# Altium footprint library JL_PCB.PCBLIB: 1129 footprints (part 6 of 72)
Each footprint in its own frame and in the unit in brackets; x right, y up, seen from the top. Pads: shape width x height; smd on the part's side, far side on the other; paste and mask are expansions set on the pad; w line width, h text height; cw(c..) or ccw(c..) is an arc to the next point about the centre after c.
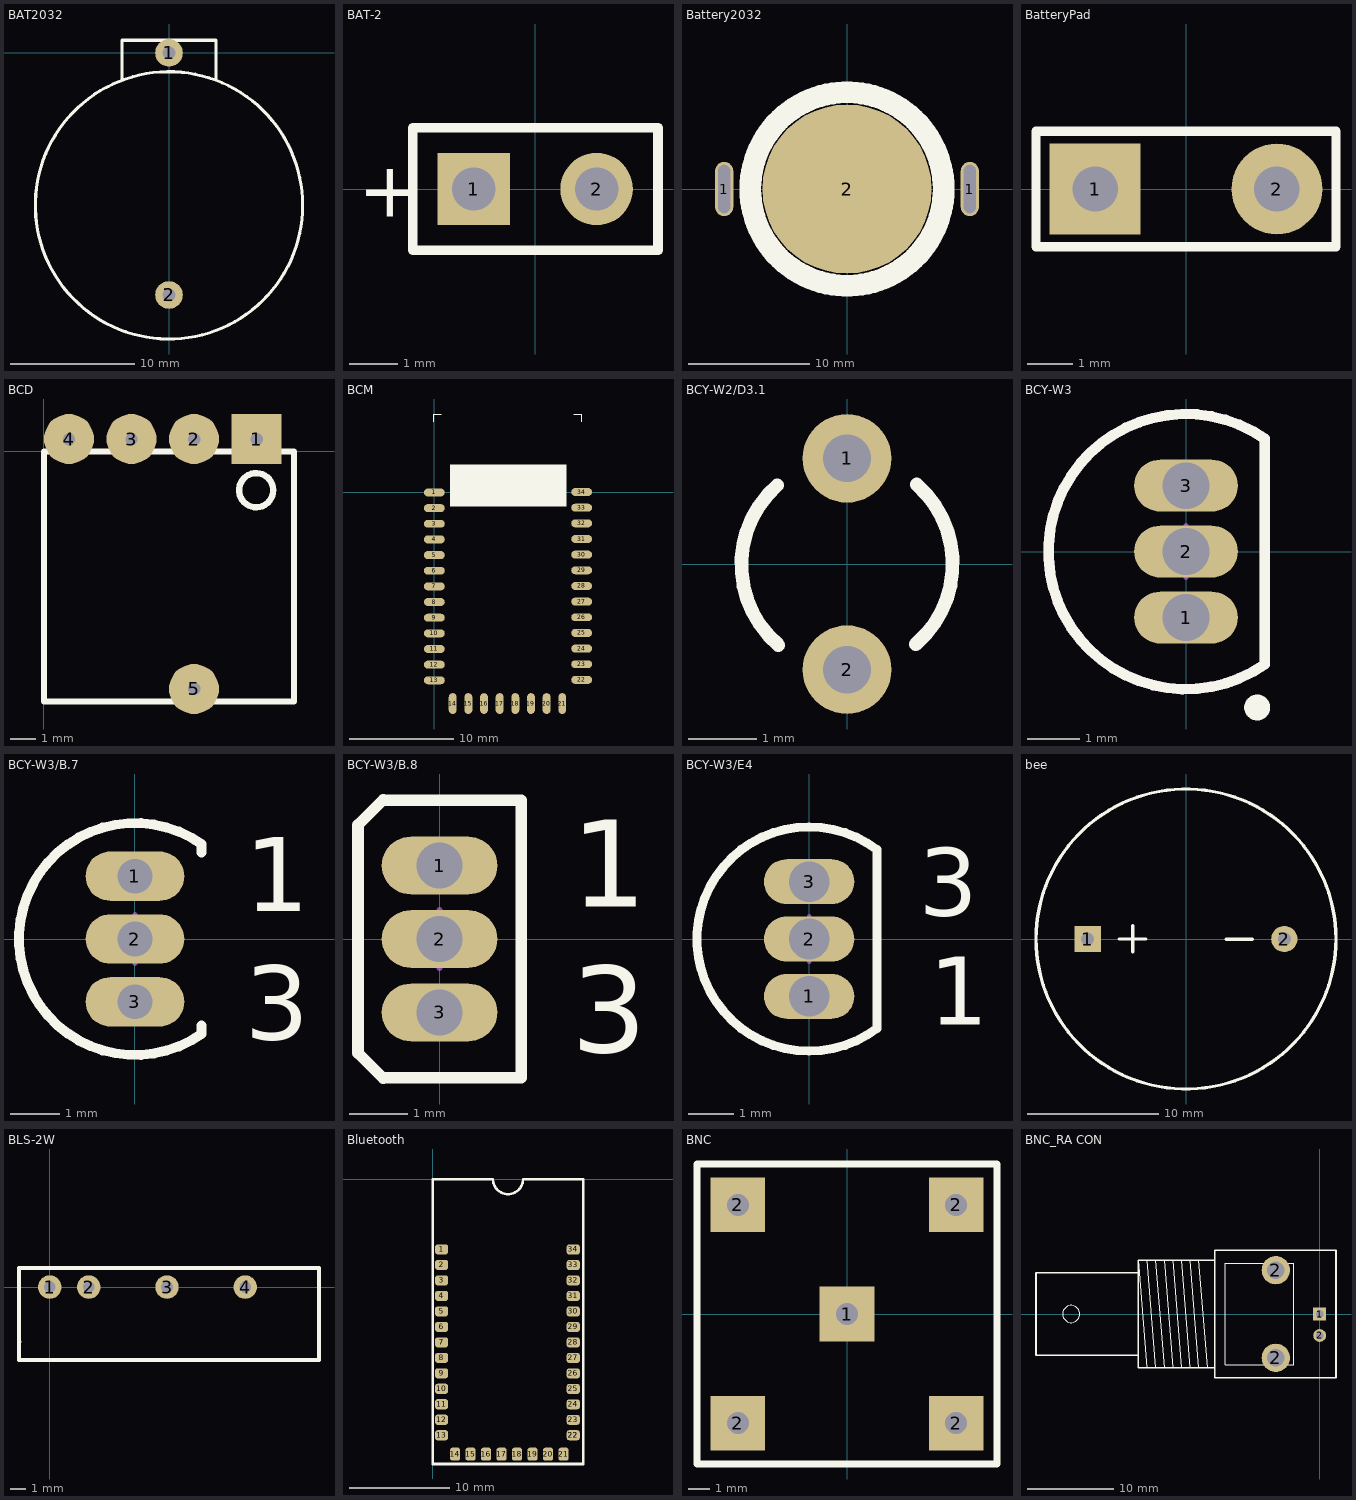
[diagram p5: the footprints below, top view; thin cyan lines are the x and y axes]

## BAT2032 [mil]
pads (2):
  round 88 hole 40: 1(0,0) 2(0,-770)
TopOverlay:
  circle w10: c0,-485 r425
  lines w10: -150,-85 -150,40 0,40 150,40 150,-85

## BAT-2 [mm] "Multicell Battery; 2 Leads"
pads (2):
  rect 1.5x1.5 hole 0.9: 1(-1.27,0)
  round 1.5 hole 0.9: 2(1.27,0)
TopOverlay:
  lines w0.2: -2.54,-1.27 -2.54,1.27 2.54,1.27 2.54,-1.27 -2.54,-1.27
  text "+" at -3.67,-0.577 h1.15

## Battery2032 [mm] "3V"
pads (3):
  oval 1.5x4.5 hole 1 slot 4 at 90 deg: 1(-10.16,0) 1(10.16,0)
  round 14 all layers, no hole: 2(0,0)
TopOverlay:
  circle w1.8: c0,0 r8

## BatteryPad [mm]
pads (2):
  rect 2x2 hole 1: 1(-2,0)
  round 2 hole 1: 2(2,0)
TopOverlay:
  lines w0.2: -3.3,-1.27 -3.3,1.27 3.3,1.27 3.3,-1.27 -3.3,-1.27

## BCD [mm]
pads (5):
  rect 2x2 hole 0.5: 1(8.5,0.5)
  round 2 hole 0.5: 2(6,0.5) 3(3.5,0.5) 4(1,0.5) 5(6,-9.5)
TopOverlay:
  circle w0.254: c8.486,-1.549 r0.683
  lines w0.254: 0,-10 0,0 10,0 10,-10 0,-10

## BCM [mm]
pads (34):
  oval 2x0.76 smd: 1(0.01,0) 2(0.01,-1.5) 3(0.01,-3) 4(0.01,-4.5) 5(0.01,-6) 6(0.01,-7.5) 7(0.01,-9) 8(0.01,-10.5) 9(0.01,-12) 10(0.01,-13.5) 11(0.01,-15) 12(0.01,-16.5) 13(0.01,-18) 22(14.13,-17.96) 23(14.13,-16.46) 24(14.13,-14.96) 25(14.13,-13.46) 26(14.13,-11.96) 27(14.13,-10.46) 28(14.13,-8.96) 29(14.13,-7.46) 30(14.13,-5.96) 31(14.13,-4.46) 32(14.13,-2.96) 33(14.13,-1.46) 34(14.13,0.04)
  oval 0.76x2 smd: 14(1.77,-20.23) 15(3.27,-20.23) 16(4.77,-20.23) 17(6.27,-20.23) 18(7.77,-20.23) 19(9.27,-20.23) 20(10.77,-20.23) 21(12.27,-20.23)
TopOverlay:
  region: 12.689,-1.33 12.689,2.67 1.489,2.67 1.489,-1.33
  lines w0.1: -0.06,6.77 -0.06,7.52 0.69,7.52 ; 13.39,7.52 14.14,7.52 14.14,6.77

## BCY-W2/D3.1 [mm] "Crystal, Thru-Hole; 2 Leads; Body 3.1 x 8.2 mm (Dia.xH)"
height 8.2
pads (2):
  round 1.3 hole 0.7: 1(0,1.55) 2(0,-1.55)
TopOverlay:
  lines w0.2: -1.022,1.155 ccw(c0,-0.01) -1.006,-1.189 ; 1.006,-1.179 ccw(c0,0) 1.022,1.165

## BCY-W3 [mm] "TO, Flat Index; 3 In-Line, Axial Leads; Body Dia. 4.8mm; Leads 0.55 x 0.51 mm (max)"
height 5.33
pads (3):
  oval 2x1 hole 0.9: 1(0,-1.27) 2(0,0) 3(0,1.27)
TopOverlay:
  circle w0.25: c1.371,-3.003 r0.125
  lines w0.2: 1.52,-2.171 cw(c0,0) 1.52,2.171 1.52,-2.171
Mechanical13:
  lines w0.2: 1.52,-2.171 cw(c0,0) 1.52,2.171 1.52,-2.171
Mechanical15:
  lines w0.1: -0.5,0 0.5,0 ; 0,-0.5 0,0.5
3D body: height 5.33, standoff 0, extent -2.651,-2.661 1.52,2.661

## BCY-W3/B.7 [mm] "TO, Flat Index; 3 In-Line, Axial Leads; Body Dia. 4.6mm; Leads 0.41 x 0.39 mm (max)"
height 4.7
pads (3):
  oval 2x1 hole 0.7: 1(0,1.27) 2(0,0) 3(0,-1.27)
TopOverlay:
  lines w0.2: 1.35,-1.75 1.35,-1.92 cw(c0,0) 1.35,1.92 1.35,1.75
  text "3" at 2.224,-2.035 h1.5
  text "1" at 2.224,0.56 h1.5
Mechanical15:
  lines w0.1: -0.5,0 0.5,0 ; 0,-0.5 0,0.5
3D body "TO-92A.STEP": height 8, standoff -3, extent -2.406,-2.4 1.524,2.4

## BCY-W3/B.8 [mm] "TO, Flat Index; 3 In-Line, Axial Leads; Body Dia. 4.6mm; Lead Dia. 0.5 mm (max)"
height 4.01
pads (3):
  oval 2x1 hole 0.8: 1(0,1.27) 2(0,0) 3(0,-1.27)
TopOverlay:
  lines w0.2: -0.97,-2.41 -1.41,-1.97 -1.41,1.97 -0.97,2.41 ; -0.97,-2.4 1.41,-2.4 1.41,2.4 -0.97,2.4
  text "3" at 2.275,-1.963 h1.5
  text "1" at 2.275,0.555 h1.5
Mechanical15:
  lines w0.1: -0.5,0 0.5,0 ; 0,-0.5 0,0.5

## BCY-W3/E4 [mm] "TO, Flat Index; 3 In-Line, Axial Leads; Body Dia. 4.5mm; Leads 0.51 x 0.48 mm (max)"
height 6.86
pads (3):
  oval 2x1 hole 0.9: 1(0,-1.27) 2(0,0) 3(0,1.27)
TopOverlay:
  lines w0.2: 1.5,-1.98 cw(c0,0) 1.5,1.98 1.5,-1.98
  text "1" at 2.66,-1.9 h1.5
  text "3" at 2.43,0.51 h1.5
Mechanical15:
  lines w0.1: -0.5,0 0.5,0 ; 0,-0.5 0,0.5
3D body "TO-92A.STEP": height 8, standoff -3, extent -2.388,-2.4 1.542,2.4

## bee [mm]
pads (2):
  rect 2x2 hole 1: 1(-7.493,0)
  round 2 hole 1: 2(7.493,0)
TopOverlay:
  circle w0.254: c0,0 r11.431
  lines w0.254: -5.08,0 -3.048,0 ; -4.064,-0.991 -4.064,1.016 ; 3.048,-0.025 5.055,-0.025
3D body "User Library-CEP2242_Buzzer.step": height 7.59, standoff -5.5, extent -6.998,-7.137 6.693,6.553

## BLS-2W [mil]
pads (4):
  round 60 hole 30: 1(0,0) 2(100,0) 3(300,0) 4(500,0)
TopOverlay:
  lines w10: -78.74,-138.74 -77.48,-140 ; -78.74,-187.01 688.98,-187.01 688.98,49.21 -78.74,49.21 -78.74,-187.01

## Bluetooth [mm]
pads (35):
  rrect50% 1.3x1 smd: 1(0.9,-6.99) 2(0.9,-8.53) 3(0.9,-10.07) 4(0.9,-11.61) 5(0.9,-13.15) 6(0.9,-14.69) 7(0.9,-16.23) 8(0.9,-17.77) 9(0.9,-19.31) 10(0.9,-20.85) 11(0.9,-22.39) 12(0.9,-23.93) 13(0.9,-25.474) 22(13.987,-25.474) 22(13.987,-25.474) 23(13.987,-23.934) 24(13.987,-22.394) 25(13.987,-20.854) 26(13.987,-19.314) 27(13.987,-17.774) 28(13.987,-16.234) 29(13.987,-14.694) 30(13.987,-13.154) 31(13.987,-11.614) 32(13.987,-10.074) 33(13.987,-8.534) 34(13.987,-6.994)
  rrect50% 1x1.3 smd: 14(2.24,-27.356) 15(3.78,-27.356) 16(5.32,-27.356) 17(6.86,-27.356) 18(8.4,-27.356) 19(9.94,-27.356) 20(11.48,-27.356) 21(13.02,-27.356)
TopOverlay:
  lines w0.254: 0,-28.33 15,-28.33 ; 0,-28.321 0,0 6,0 ccw(c7.5,0) 9,0 ; 9.036,0 15,0 15,-28.321

## BNC [mil]
pads (5):
  rect 100x100 hole 40: 1(0,0) 2(-200,-200) 2(-200,200) 2(200,-200) 2(200,200)
TopOverlay:
  lines w12: -275,-275 275,-275 275,275 -275,275 -275,-275
3D body "User Library-J01003A1947.step": height 886.43, standoff -156.88, extent -236.22,-238 236.22,234.44

## BNC_RA CON [mm] "Connector; BNC Elbow"
pads (4):
  rect 1.5x1.5 hole 0.9: 1(0,0)
  round 3.3 hole 2: 2(-5.1,-5.1) 2(-5.1,5.1)
  round 1.5 hole 0.9: 2(0,-2.5)
TopOverlay:
  circle w0.025: c-28.9,0 r1
  lines w0.025: -20.1,-6.25 -21.1,6.25 ; -20.1,6.25 -19.1,-6.25 ; -19.1,6.25 -18.1,-6.25 ; -18.1,6.25 -17.1,-6.25 ; -17.1,6.25 -16.1,-6.25 ; -16.1,6.25 -15.1,-6.25 ; -15.1,6.25 -14.1,-6.25 ; -14.1,6.25 -13.1,-6.25 ; -21.1,-4.8 -21.1,-6.25 -12.2,-6.25 ; -21.1,-4.8 -21.1,4.8 ; -21.1,-4.8 -33,-4.8 -33,4.8 -21.1,4.8 ; -21.1,4.8 -21.1,6.25 ; -21.1,6.25 -12.2,6.25 ; -12.2,-6.25 -12.2,-7.4 1.9,-7.4 1.9,7.4 -12.2,7.4 -12.2,6.25 ; -12.2,-6.25 -12.2,6.25 ; -11,-5.9 -11,5.9 -3,5.9 -3,-5.9 -11,-5.9
  lines w0.2: -21.1,-4.8 -21.1,-6.25 -12.2,-6.25 ; -21.1,-4.8 -33,-4.8 -33,4.8 -21.1,4.8 ; -21.1,-4.8 -21.1,4.8 ; -21.1,4.8 -21.1,6.25 -12.2,6.25 ; -12.2,-6.25 -12.2,-7.4 1.9,-7.4 1.9,7.4 -12.2,7.4 -12.2,6.25 ; -12.2,-6.25 -12.2,6.25
3D body "User Library-BNC-144.STEP": height 12.56, standoff -4.73, extent -33.655,-7.379 1.27,7.379